# Altium schematic symbol library LATTICEPLDS_Library.SchLib: 291 symbols (part 20 of 32) (continued)
## LFE5U-85F-BG756 (continued)
part H pins: AB10 VCCIO8 (power), AC10 VCCIO8 (power), AG1 PB4A/ D7/IO7 (io), AG3 PB13A/ SN/CSN (io), AG4 INITN (io), AG5 TDO (io), AH1 PB4B/ D6/IO6 (io), AH3 PB13B/ CS1N (io), AH4 PROGRAMN (io), AJ1 PB6A/ D5/MISO2/IO5 (io), AJ2 PB11A/ D1/MISO/IO1 (io), AJ3 PB15A/ HOLDN/DI/BUSY/CSSPIN/CEN (io), AJ4 DONE (io), AJ5 TDI (io), AK1 PB6B/ D4/MOSI2/IO4 (io), AK2 PB11B/ D0/MOSI/IO0 (io), AK3 PB15B/ DOUT/CSON (io), AK4 CFG_2 (io), AK5 TCK (io), AL1 PB9A/ D3/IO3 (io), AL3 PB18A/ WRITEN (io), AL4 CFG_1 (io), AM2 PB9B/ D2/IO2 (io), AM3 CCLK/ MCLK/SCK (io), AM4 CFG_0 (io), AM5 TMS (io)
part I pins: AA11 GND (power), AA22 GND (power), AB11 GND (power), AB12 GND (power), AB13 GND (power), AB14 GND (power), AB15 GND (power), AB16 GND (power), AB17 GND (power), AB18 GND (power), AB19 GND (power), AB20 GND (power), AB21 GND (power), AB22 GND (power), AC12 GND (power), AC21 GND (power), AD2 GND (power), AD5 GND (power), AD28 GND (power), AD31 GND (power), AF11 GND (power), AF12 GND (power), AF14 GND (power), AF15 GND (power), AF16 GND (power), AF17 GND (power), AF19 GND (power), AF20 GND (power), AF23 GND (power), AG11 GND (power), AG14 GND (power), AG15 GND (power), AG16 GND (power), AG17 GND (power), AG20 GND (power), AG23 GND (power), AH2 GND (power), AH5 GND (power), AH7 GND (power), AH8 GND (power), AH11 GND (power), AH14 GND (power), AH15 GND (power), AH16 GND (power), AH17 GND (power), AH20 GND (power), AH23 GND (power), AH24 GND (power), AH25 GND (power), AH26 GND (power), AH29 GND (power), AH31 GND (power), AJ7 GND (power), AJ8 GND (power), AJ11 GND (power), AJ14 GND (power), AJ17 GND (power), AJ20 GND (power), AJ23 GND (power), AJ26 GND (power), AK7 GND (power), AK8 GND (power), AK11 GND (power), AK14 GND (power), AK17 GND (power), AK20 GND (power), AK23 GND (power), AK26 GND (power), AL2 GND (power), AL5 GND (power), AL7 GND (power), AL8 GND (power), AL9 GND (power), AL11 GND (power), AL12 GND (power), AL14 GND (power), AL15 GND (power), AL17 GND (power), AL18 GND (power), AL20 GND (power), AL21 GND (power), AL23 GND (power), AL24 GND (power), AL26 GND (power), AL29 GND (power), AL31 GND (power), AM7 GND (power), AM14 GND (power), AM15 GND (power), AM26 GND (power), B2 GND (power), B5 GND (power), B9 GND (power), B13 GND (power), B15 GND (power), B18 GND (power), B20 GND (power), B24 GND (power), B28 GND (power), B31 GND (power), E2 GND (power), E5 GND (power), E9 GND (power), E13 GND (power), E15 GND (power), E18 GND (power), E20 GND (power), E24 GND (power), E28 GND (power), E31 GND (power), J2 GND (power), J5 GND (power), J28 GND (power), J31 GND (power), K10 GND (power), K11 GND (power), K22 GND (power), K23 GND (power), L10 GND (power), L11 GND (power), L12 GND (power), L13 GND (power), L14 GND (power), L15 GND (power), L16 GND (power), L17 GND (power), L18 GND (power), L19 GND (power), L20 GND (power), L21 GND (power), L22 GND (power), L23 GND (power), M11 GND (power), M22 GND (power), N2 GND (power), N5 GND (power), N11 GND (power), N13 GND (power), N14 GND (power), N15 GND (power), N16 GND (power), N17 GND (power), N18 GND (power), N19 GND (power), N20 GND (power), N22 GND (power), N28 GND (power), N31 GND (power), P11 GND (power), P13 GND (power), P14 GND (power), P15 GND (power), P16 GND (power), P17 GND (power), P18 GND (power), P19 GND (power), P20 GND (power), P22 GND (power), R2 GND (power), R5 GND (power), R11 GND (power), R13 GND (power), R14 GND (power), R15 GND (power), R16 GND (power), R17 GND (power), R18 GND (power), R19 GND (power), R20 GND (power), R22 GND (power), R28 GND (power), R31 GND (power), T11 GND (power), T13 GND (power), T14 GND (power), T15 GND (power), T16 GND (power), T17 GND (power), T18 GND (power), T19 GND (power), T20 GND (power), T22 GND (power), U11 GND (power), U13 GND (power), U14 GND (power), U15 GND (power), U16 GND (power), U17 GND (power), U18 GND (power), U19 GND (power), U20 GND (power), U22 GND (power), V2 GND (power), V5 GND (power), V11 GND (power), V13 GND (power), V14 GND (power), V15 GND (power), V16 GND (power), V17 GND (power), V18 GND (power), V19 GND (power), V20 GND (power), V22 GND (power), V28 GND (power), V31 GND (power), W11 GND (power), W13 GND (power), W14 GND (power), W15 GND (power), W16 GND (power), W17 GND (power), W18 GND (power), W19 GND (power), W20 GND (power), W22 GND (power), Y2 GND (power), Y11 GND (power), Y13 GND (power), Y14 GND (power), Y15 GND (power), Y16 GND (power), Y17 GND (power), Y18 GND (power), Y19 GND (power), Y20 GND (power), Y22 GND (power), Y31 GND (power)
part J pins: AA12 VCC (power), AA13 VCC (power), AA14 VCC (power), AA15 VCC (power), AA16 VCC (power), AA17 VCC (power), AA18 VCC (power), AA19 VCC (power), AA20 VCC (power), AA21 VCC (power), AC11 VCCAUX (power), AC22 VCCAUX (power), AF22 GND (power), AG9 GND (power), AG12 GND (power), AG19 GND (power), AG22 GND (power), AH9 GND (power), AH12 GND (power), AH19 GND (power), AH22 GND (power), AJ9 GND (power), AJ10 GND (power), AJ12 GND (power), AJ13 GND (power), AJ15 GND (power), AJ16 GND (power), AJ18 GND (power), AJ19 GND (power), AJ21 GND (power), AJ22 GND (power), AJ24 GND (power), AJ25 GND (power), K13 VCCAUX (power), K20 VCCAUX (power), M12 VCC (power), M13 VCC (power), M14 VCC (power), M15 VCC (power), M16 VCC (power), M17 VCC (power), M18 VCC (power), M19 VCC (power), M20 VCC (power), M21 VCC (power), N10 VCCAUX (power), N12 VCC (power), N21 VCC (power), N23 VCCAUX (power), P12 VCC (power), P21 VCC (power), R12 VCC (power), R21 VCC (power), T12 VCC (power), T21 VCC (power), U12 VCC (power), U21 VCC (power), V12 VCC (power), V21 VCC (power), W12 VCC (power), W21 VCC (power), Y10 VCCAUX (power), Y12 VCC (power), Y21 VCC (power), Y23 VCCAUX (power)
part K pins: AC4 NC (power), AC13 GND (power), AC14 GND (power), AC15 GND (power), AC16 GND (power), AC17 GND (power), AC18 GND (power), AC19 GND (power), AC20 GND (power), AC29 NC (power), AE7 NC (power), AE26 NC (power), AG2 NC (power), AG24 NC (power), AG31 NC (power), AK9 RESERVED (power), AK10 RESERVED (power), AK12 RESERVED (power), AK13 RESERVED (power), AK15 RESERVED (power), AK16 RESERVED (power), AK18 RESERVED (power), AK19 RESERVED (power), AK21 RESERVED (power), AK22 RESERVED (power), AK24 RESERVED (power), AK25 RESERVED (power), AM8 GND (power), AM9 GND (power), AM11 GND (power), AM12 GND (power), AM17 GND (power), AM18 GND (power), AM20 GND (power), AM21 GND (power), AM23 GND (power), AM24 GND (power), E7 NC (power), E26 NC (power), G9 NC (power), G10 NC (power), G11 NC (power), G14 NC (power), G15 NC (power), G16 NC (power), G17 NC (power), G18 NC (power), G19 NC (power), G22 NC (power), G23 NC (power), G24 NC (power), H4 NC (power), H29 NC (power), L5 NC (power), L28 NC (power), V3 NC (power), V30 NC (power), W6 NC (power), W27 NC (power)

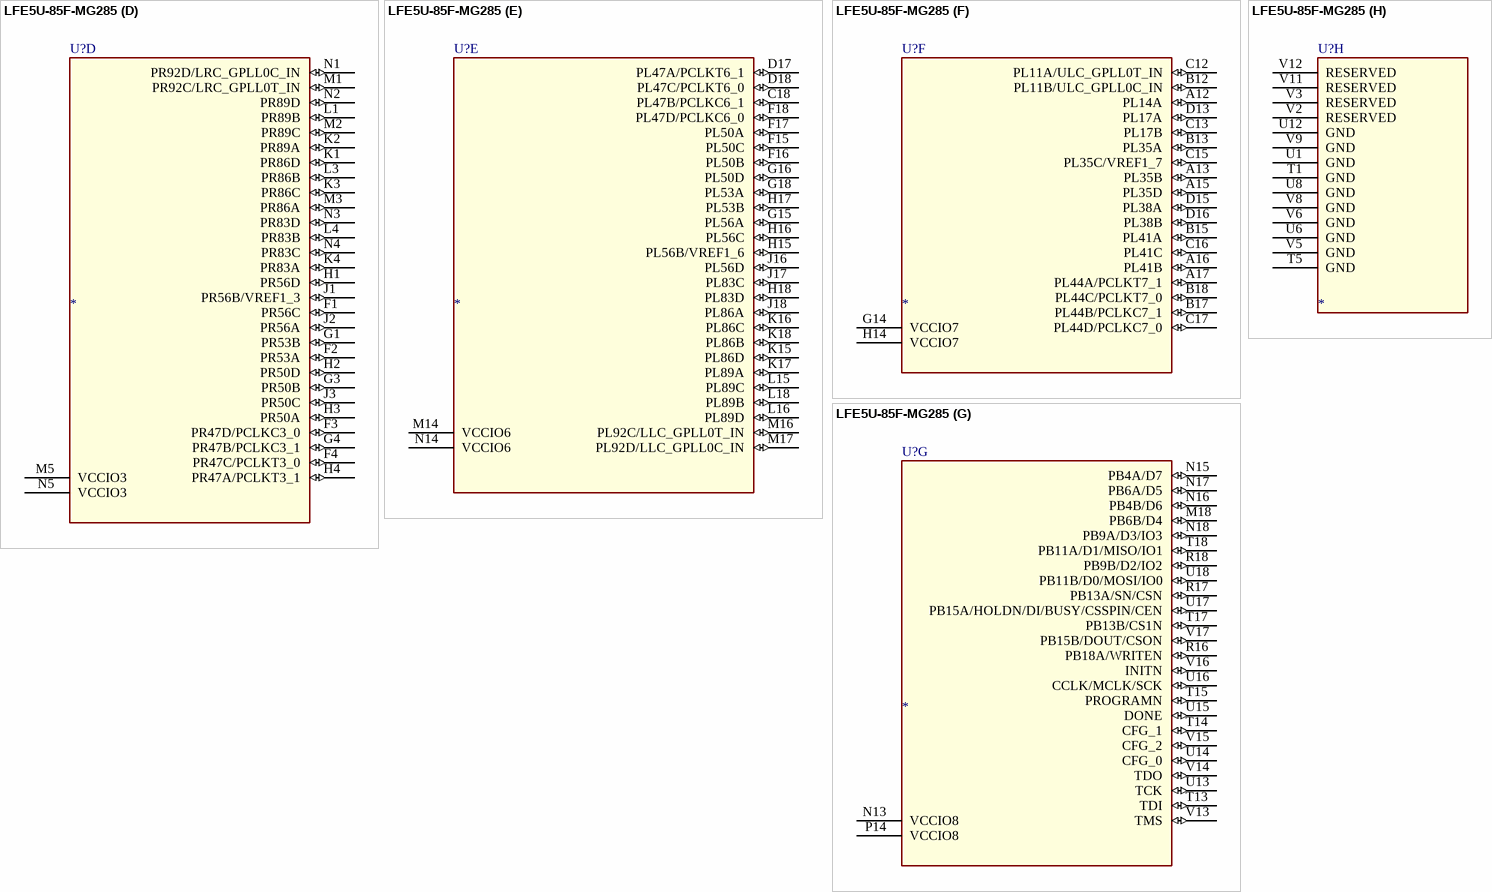
[diagram p188: symbol LFE5U-85F-MG285]

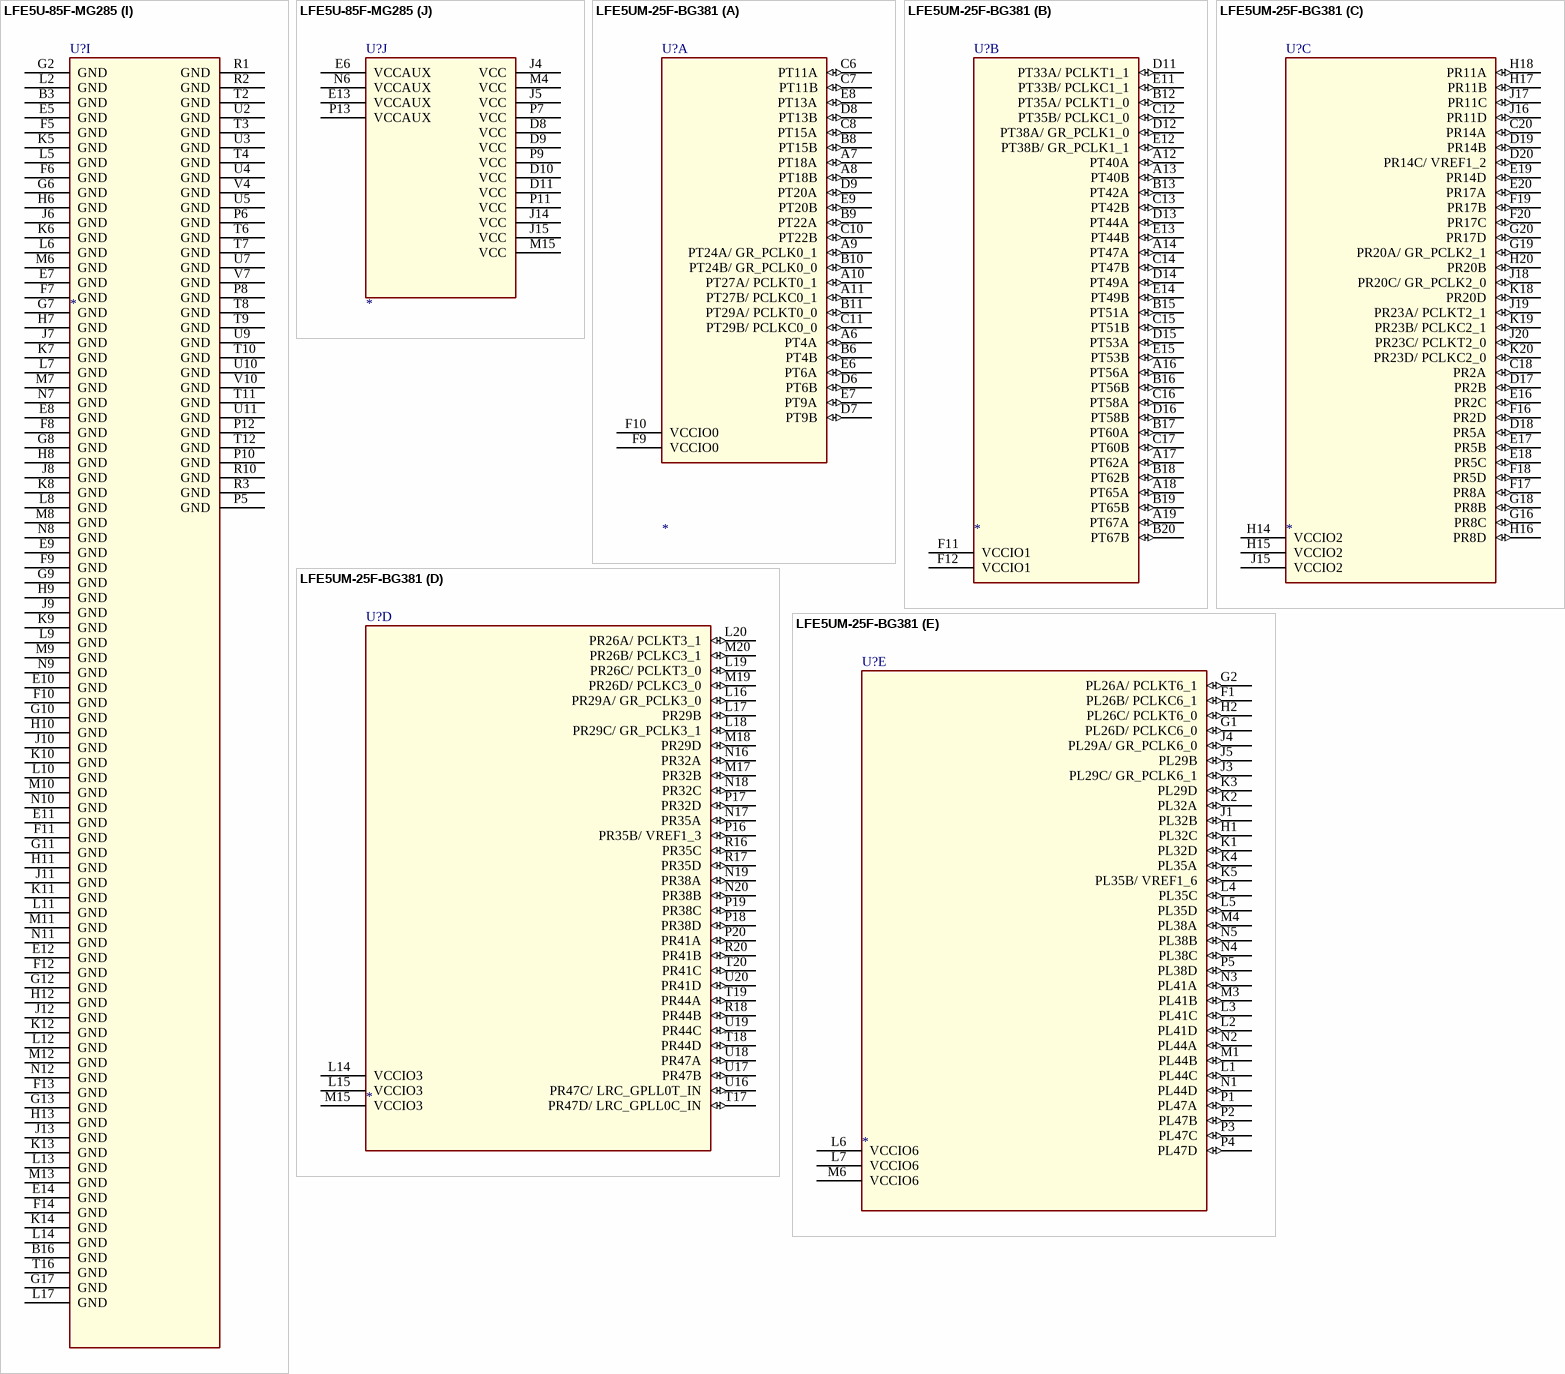
[diagram p189: symbols LFE5U-85F-MG285 to LFE5UM-25F-BG381]

## LFE5U-85F-MG285
designator U?
SWAP_INFO: (S1+S2+S3+S4+S5+S6+S7+S8+S9+S10); SPLIT_INST: TRUE
part A pins: A10 PT63B/PCLKC0_1 (io), A11 PT63A/PCLKT0_1 (io), B10 PT65A/PCLKT0_0 (io), B11 PT4A/ULC_GPLL1T_IN (io), C10 PT65B/PCLKC0_0 (io), C11 PT4B/ULC_GPLL1C_IN (io), D12 VCCIO0 (power)
part B pins: A8 PT71B/PCLKC1_0 (io), A9 PT71A/PCLKT1_0 (io), B8 PT121A/URC_GPLL1T_IN (io), B9 PT69A/PCLKT1_1 (io), C8 PT121B/URC_GPLL1C_IN (io), C9 PT69B/PCLKC1_1 (io), D7 VCCIO1 (power)
part C pins: A2 PR41C (io), A3 PR41A (io), A4 PR20B (io), A6 PR20A (io), A7 PR17B (io), B1 PR44B/PCLKC2_1 (io), B2 PR41B (io), B4 PR35C/VREF1_2 (io), B6 PR17A (io), B7 PR11B/URC_GPLL0C_IN (io), C1 PR44C/PCLKT2_0 (io), C2 PR38B (io), C3 PR35D (io), C4 PR35B (io), C6 PR14B (io), C7 PR11A/URC_GPLL0T_IN (io), D1 PR44D/PCLKC2_0 (io), D2 PR44A/PCLKT2_1 (io), D3 PR38A (io), D4 PR35A (io), D6 PR14A (io), G5 VCCIO2 (power), H5 VCCIO2 (power)
part D pins: F1 PR56C (io), F2 PR53A (io), F3 PR47D/PCLKC3_0 (io), F4 PR47C/PCLKT3_0 (io), G1 PR53B (io), G3 PR50B (io), G4 PR47B/PCLKC3_1 (io), H1 PR56D (io), H2 PR50D (io), H3 PR50A (io), H4 PR47A/PCLKT3_1 (io), J1 PR56B/VREF1_3 (io), J2 PR56A (io), J3 PR50C (io), K1 PR86D (io), K2 PR89A (io), K3 PR86C (io), K4 PR83A (io), L1 PR89B (io), L3 PR86B (io), L4 PR83B (io), M1 PR92C/LRC_GPLL0T_IN (io), M2 PR89C (io), M3 PR86A (io), M5 VCCIO3 (power), N1 PR92D/LRC_GPLL0C_IN (io), N2 PR89D (io), N3 PR83D (io), N4 PR83C (io), N5 VCCIO3 (power)
part E pins: C18 PL47B/PCLKC6_1 (io), D17 PL47A/PCLKT6_1 (io), D18 PL47C/PCLKT6_0 (io), F15 PL50C (io), F16 PL50B (io), F17 PL50A (io), F18 PL47D/PCLKC6_0 (io), G15 PL56A (io), G16 PL50D (io), G18 PL53A (io), H15 PL56B/VREF1_6 (io), H16 PL56C (io), H17 PL53B (io), H18 PL83D (io), J16 PL56D (io), J17 PL83C (io), J18 PL86A (io), K15 PL86D (io), K16 PL86C (io), K17 PL89A (io), K18 PL86B (io), L15 PL89C (io), L16 PL89D (io), L18 PL89B (io), M14 VCCIO6 (power), M16 PL92C/LLC_GPLL0T_IN (io), M17 PL92D/LLC_GPLL0C_IN (io), N14 VCCIO6 (power)
part F pins: A12 PL14A (io), A13 PL35B (io), A15 PL35D (io), A16 PL41B (io), A17 PL44A/PCLKT7_1 (io), B12 PL11B/ULC_GPLL0C_IN (io), B13 PL35A (io), B15 PL41A (io), B17 PL44B/PCLKC7_1 (io), B18 PL44C/PCLKT7_0 (io), C12 PL11A/ULC_GPLL0T_IN (io), C13 PL17B (io), C15 PL35C/VREF1_7 (io), C16 PL41C (io), C17 PL44D/PCLKC7_0 (io), D13 PL17A (io), D15 PL38A (io), D16 PL38B (io), G14 VCCIO7 (power), H14 VCCIO7 (power)
part G pins: M18 PB6B/D4 (io), N13 VCCIO8 (power), N15 PB4A/D7 (io), N16 PB4B/D6 (io), N17 PB6A/D5 (io), N18 PB9A/D3/IO3 (io), P14 VCCIO8 (power), R16 PB18A/WRITEN (io), R17 PB13A/SN/CSN (io), R18 PB9B/D2/IO2 (io), T13 TDI (io), T14 CFG_1 (io), T15 PROGRAMN (io), T17 PB13B/CS1N (io), T18 PB11A/D1/MISO/IO1 (io), U13 TCK (io), U14 CFG_0 (io), U15 DONE (io), U16 CCLK/MCLK/SCK (io), U17 PB15A/HOLDN/DI/BUSY/CSSPIN/CEN (io), U18 PB11B/D0/MOSI/IO0 (io), V13 TMS (io), V14 TDO (io), V15 CFG_2 (io), V16 INITN (io), V17 PB15B/DOUT/CSON (io)
part H pins: T1 GND (power), T5 GND (power), U1 GND (power), U6 GND (power), U8 GND (power), U12 GND (power), V2 RESERVED (power), V3 RESERVED (power), V5 GND (power), V6 GND (power), V8 GND (power), V9 GND (power), V11 RESERVED (power), V12 RESERVED (power)
part I pins: B3 GND (power), B16 GND (power), E5 GND (power), E7 GND (power), E8 GND (power), E9 GND (power), E10 GND (power), E11 GND (power), E12 GND (power), E14 GND (power), F5 GND (power), F6 GND (power), F7 GND (power), F8 GND (power), F9 GND (power), F10 GND (power), F11 GND (power), F12 GND (power), F13 GND (power), F14 GND (power), G2 GND (power), G6 GND (power), G7 GND (power), G8 GND (power), G9 GND (power), G10 GND (power), G11 GND (power), G12 GND (power), G13 GND (power), G17 GND (power), H6 GND (power), H7 GND (power), H8 GND (power), H9 GND (power), H10 GND (power), H11 GND (power), H12 GND (power), H13 GND (power), J6 GND (power), J7 GND (power), J8 GND (power), J9 GND (power), J10 GND (power), J11 GND (power), J12 GND (power), J13 GND (power), K5 GND (power), K6 GND (power), K7 GND (power), K8 GND (power), K9 GND (power), K10 GND (power), K11 GND (power), K12 GND (power), K13 GND (power), K14 GND (power), L2 GND (power), L5 GND (power), L6 GND (power), L7 GND (power), L8 GND (power), L9 GND (power), L10 GND (power), L11 GND (power), L12 GND (power), L13 GND (power), L14 GND (power), L17 GND (power), M6 GND (power), M7 GND (power), M8 GND (power), M9 GND (power), M10 GND (power), M11 GND (power), M12 GND (power), M13 GND (power), N7 GND (power), N8 GND (power), N9 GND (power), N10 GND (power), N11 GND (power), N12 GND (power), P5 GND (power), P6 GND (power), P8 GND (power), P10 GND (power), P12 GND (power), R1 GND (power), R2 GND (power), R3 GND (power), R10 GND (power), T2 GND (power), T3 GND (power), T4 GND (power), T6 GND (power), T7 GND (power), T8 GND (power), T9 GND (power), T10 GND (power), T11 GND (power), T12 GND (power), T16 GND (power), U2 GND (power), U3 GND (power), U4 GND (power), U5 GND (power), U7 GND (power), U9 GND (power), U10 GND (power), U11 GND (power), V4 GND (power), V7 GND (power), V10 GND (power)
part J pins: D8 VCC (power), D9 VCC (power), D10 VCC (power), D11 VCC (power), E6 VCCAUX (power), E13 VCCAUX (power), J4 VCC (power), J5 VCC (power), J14 VCC (power), J15 VCC (power), M4 VCC (power), M15 VCC (power), N6 VCCAUX (power), P7 VCC (power), P9 VCC (power), P11 VCC (power), P13 VCCAUX (power)

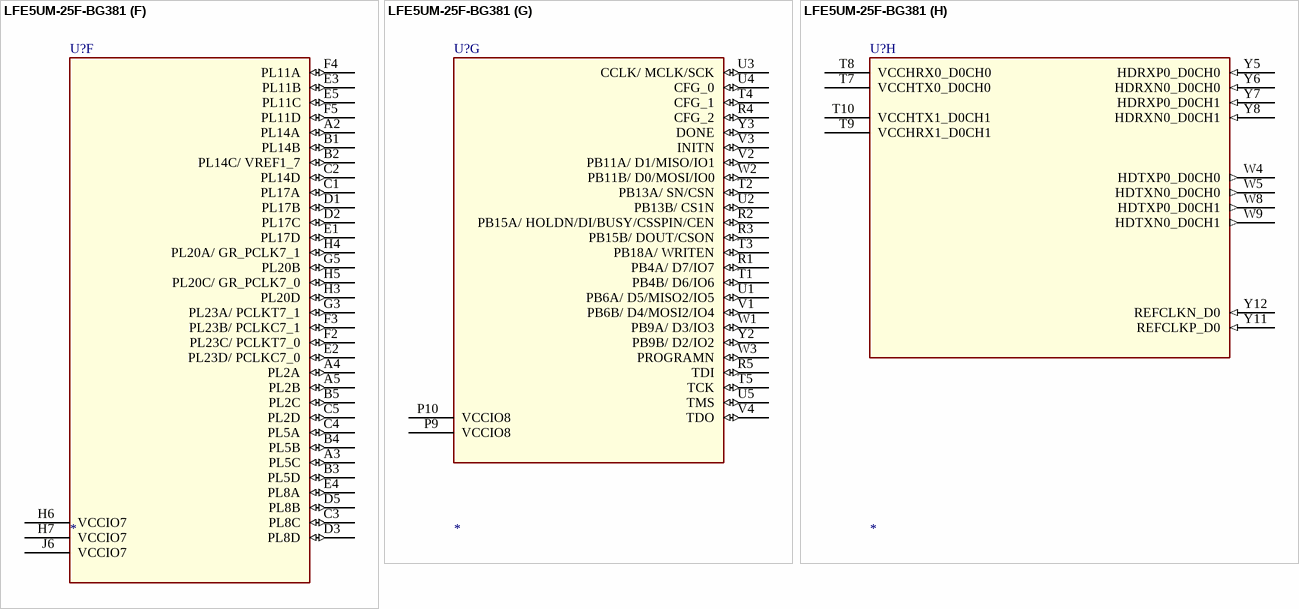
[diagram p190: symbol LFE5UM-25F-BG381]

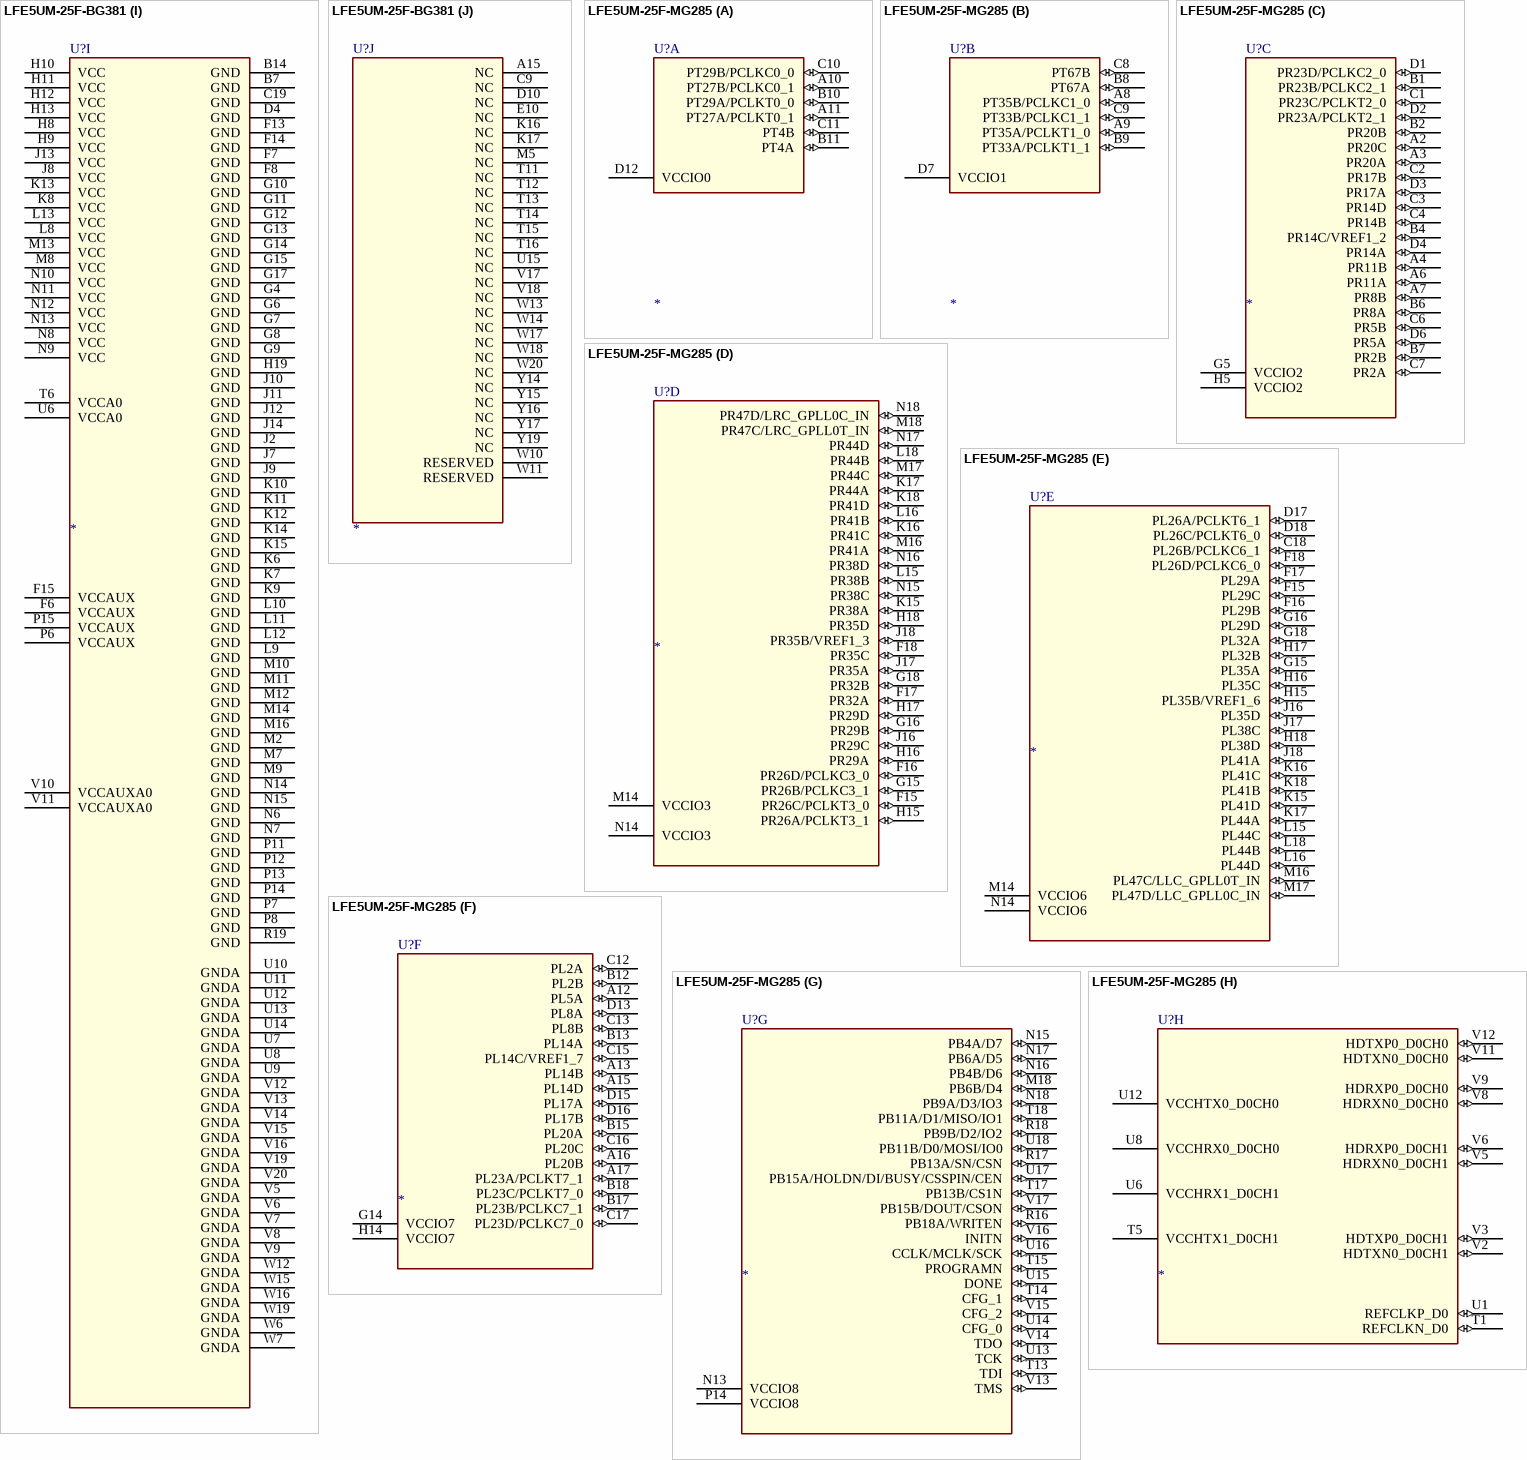
[diagram p191: symbols LFE5UM-25F-BG381 to LFE5UM-25F-MG285]

## LFE5UM-25F-BG381
designator U?
SWAP_INFO: (S1+S2+S3+S4+S5+S6+S7+S8+S9+S10); SPLIT_INST: TRUE
part A pins: A6 PT4A (io), A7 PT18A (io), A8 PT18B (io), A9 PT24A/ GR_PCLK0_1 (io), A10 PT27A/ PCLKT0_1 (io), A11 PT27B/ PCLKC0_1 (io), B6 PT4B (io), B8 PT15B (io), B9 PT22A (io), B10 PT24B/ GR_PCLK0_0 (io), B11 PT29A/ PCLKT0_0 (io), C6 PT11A (io), C7 PT11B (io), C8 PT15A (io), C10 PT22B (io), C11 PT29B/ PCLKC0_0 (io), D6 PT6B (io), D7 PT9B (io), D8 PT13B (io), D9 PT20A (io), E6 PT6A (io), E7 PT9A (io), E8 PT13A (io), E9 PT20B (io), F9 VCCIO0 (power), F10 VCCIO0 (power)
part B pins: A12 PT40A (io), A13 PT40B (io), A14 PT47A (io), A16 PT56A (io), A17 PT62A (io), A18 PT65A (io), A19 PT67A (io), B12 PT35A/ PCLKT1_0 (io), B13 PT42A (io), B15 PT51A (io), B16 PT56B (io), B17 PT60A (io), B18 PT62B (io), B19 PT65B (io), B20 PT67B (io), C12 PT35B/ PCLKC1_0 (io), C13 PT42B (io), C14 PT47B (io), C15 PT51B (io), C16 PT58A (io), C17 PT60B (io), D11 PT33A/ PCLKT1_1 (io), D12 PT38A/ GR_PCLK1_0 (io), D13 PT44A (io), D14 PT49A (io), D15 PT53A (io), D16 PT58B (io), E11 PT33B/ PCLKC1_1 (io), E12 PT38B/ GR_PCLK1_1 (io), E13 PT44B (io), E14 PT49B (io), E15 PT53B (io), F11 VCCIO1 (power), F12 VCCIO1 (power)
part C pins: C18 PR2A (io), C20 PR14A (io), D17 PR2B (io), D18 PR5A (io), D19 PR14B (io), D20 PR14C/ VREF1_2 (io), E16 PR2C (io), E17 PR5B (io), E18 PR5C (io), E19 PR14D (io), E20 PR17A (io), F16 PR2D (io), F17 PR8A (io), F18 PR5D (io), F19 PR17B (io), F20 PR17C (io), G16 PR8C (io), G18 PR8B (io), G19 PR20A/ GR_PCLK2_1 (io), G20 PR17D (io), H14 VCCIO2 (power), H15 VCCIO2 (power), H16 PR8D (io), H17 PR11B (io), H18 PR11A (io), H20 PR20B (io), J15 VCCIO2 (power), J16 PR11D (io), J17 PR11C (io), J18 PR20C/ GR_PCLK2_0 (io), J19 PR23A/ PCLKT2_1 (io), J20 PR23C/ PCLKT2_0 (io), K18 PR20D (io), K19 PR23B/ PCLKC2_1 (io), K20 PR23D/ PCLKC2_0 (io)
part D pins: L14 VCCIO3 (power), L15 VCCIO3 (power), L16 PR29A/ GR_PCLK3_0 (io), L17 PR29B (io), L18 PR29C/ GR_PCLK3_1 (io), L19 PR26C/ PCLKT3_0 (io), L20 PR26A/ PCLKT3_1 (io), M15 VCCIO3 (power), M17 PR32B (io), M18 PR29D (io), M19 PR26D/ PCLKC3_0 (io), M20 PR26B/ PCLKC3_1 (io), N16 PR32A (io), N17 PR35A (io), N18 PR32C (io), N19 PR38A (io), N20 PR38B (io), P16 PR35B/ VREF1_3 (io), P17 PR32D (io), P18 PR38D (io), P19 PR38C (io), P20 PR41A (io), R16 PR35C (io), R17 PR35D (io), R18 PR44B (io), R20 PR41B (io), T17 PR47D/ LRC_GPLL0C_IN (io), T18 PR44D (io), T19 PR44A (io), T20 PR41C (io), U16 PR47C/ LRC_GPLL0T_IN (io), U17 PR47B (io), U18 PR47A (io), U19 PR44C (io), U20 PR41D (io)
part E pins: F1 PL26B/ PCLKC6_1 (io), G1 PL26D/ PCLKC6_0 (io), G2 PL26A/ PCLKT6_1 (io), H1 PL32C (io), H2 PL26C/ PCLKT6_0 (io), J1 PL32B (io), J3 PL29C/ GR_PCLK6_1 (io), J4 PL29A/ GR_PCLK6_0 (io), J5 PL29B (io), K1 PL32D (io), K2 PL32A (io), K3 PL29D (io), K4 PL35A (io), K5 PL35B/ VREF1_6 (io), L1 PL44C (io), L2 PL41D (io), L3 PL41C (io), L4 PL35C (io), L5 PL35D (io), L6 VCCIO6 (power), L7 VCCIO6 (power), M1 PL44B (io), M3 PL41B (io), M4 PL38A (io), M6 VCCIO6 (power), N1 PL44D (io), N2 PL44A (io), N3 PL41A (io), N4 PL38C (io), N5 PL38B (io), P1 PL47A (io), P2 PL47B (io), P3 PL47C (io), P4 PL47D (io), P5 PL38D (io)
part F pins: A2 PL14A (io), A3 PL5C (io), A4 PL2A (io), A5 PL2B (io), B1 PL14B (io), B2 PL14C/ VREF1_7 (io), B3 PL5D (io), B4 PL5B (io), B5 PL2C (io), C1 PL17A (io), C2 PL14D (io), C3 PL8C (io), C4 PL5A (io), C5 PL2D (io), D1 PL17B (io), D2 PL17C (io), D3 PL8D (io), D5 PL8B (io), E1 PL17D (io), E2 PL23D/ PCLKC7_0 (io), E3 PL11B (io), E4 PL8A (io), E5 PL11C (io), F2 PL23C/ PCLKT7_0 (io), F3 PL23B/ PCLKC7_1 (io), F4 PL11A (io), F5 PL11D (io), G3 PL23A/ PCLKT7_1 (io), G5 PL20B (io), H3 PL20D (io), H4 PL20A/ GR_PCLK7_1 (io), H5 PL20C/ GR_PCLK7_0 (io), H6 VCCIO7 (power), H7 VCCIO7 (power), J6 VCCIO7 (power)
part G pins: P9 VCCIO8 (power), P10 VCCIO8 (power), R1 PB4A/ D7/IO7 (io), R2 PB15A/ HOLDN/DI/BUSY/CSSPIN/CEN (io), R3 PB15B/ DOUT/CSON (io), R4 CFG_2 (io), R5 TDI (io), T1 PB4B/ D6/IO6 (io), T2 PB13A/ SN/CSN (io), T3 PB18A/ WRITEN (io), T4 CFG_1 (io), T5 TCK (io), U1 PB6A/ D5/MISO2/IO5 (io), U2 PB13B/ CS1N (io), U3 CCLK/ MCLK/SCK (io), U4 CFG_0 (io), U5 TMS (io), V1 PB6B/ D4/MOSI2/IO4 (io), V2 PB11A/ D1/MISO/IO1 (io), V3 INITN (io), V4 TDO (io), W1 PB9A/ D3/IO3 (io), W2 PB11B/ D0/MOSI/IO0 (io), W3 PROGRAMN (io), Y2 PB9B/ D2/IO2 (io), Y3 DONE (io)
part H pins: T7 VCCHTX0_D0CH0 (power), T8 VCCHRX0_D0CH0 (power), T9 VCCHRX1_D0CH1 (power), T10 VCCHTX1_D0CH1 (power), W4 HDTXP0_D0CH0 (out), W5 HDTXN0_D0CH0 (out), W8 HDTXP0_D0CH1 (out), W9 HDTXN0_D0CH1 (out), Y5 HDRXP0_D0CH0 (in), Y6 HDRXN0_D0CH0 (in), Y7 HDRXP0_D0CH1 (in), Y8 HDRXN0_D0CH1 (in), Y11 REFCLKP_D0 (in), Y12 REFCLKN_D0 (in)
part I pins: B7 GND (power), B14 GND (power), C19 GND (power), D4 GND (power), F6 VCCAUX (power), F7 GND (power), F8 GND (power), F13 GND (power), F14 GND (power), F15 VCCAUX (power), G4 GND (power), G6 GND (power), G7 GND (power), G8 GND (power), G9 GND (power), G10 GND (power), G11 GND (power), G12 GND (power), G13 GND (power), G14 GND (power), G15 GND (power), G17 GND (power), H8 VCC (power), H9 VCC (power), H10 VCC (power), H11 VCC (power), H12 VCC (power), H13 VCC (power), H19 GND (power), J2 GND (power), J7 GND (power), J8 VCC (power), J9 GND (power), J10 GND (power), J11 GND (power), J12 GND (power), J13 VCC (power), J14 GND (power), K6 GND (power), K7 GND (power), K8 VCC (power), K9 GND (power), K10 GND (power), K11 GND (power), K12 GND (power), K13 VCC (power), K14 GND (power), K15 GND (power), L8 VCC (power), L9 GND (power), L10 GND (power), L11 GND (power), L12 GND (power), L13 VCC (power), M2 GND (power), M7 GND (power), M8 VCC (power), M9 GND (power), M10 GND (power), M11 GND (power), M12 GND (power), M13 VCC (power), M14 GND (power), M16 GND (power), N6 GND (power), N7 GND (power), N8 VCC (power), N9 VCC (power), N10 VCC (power), N11 VCC (power), N12 VCC (power), N13 VCC (power), N14 GND (power), N15 GND (power), P6 VCCAUX (power), P7 GND (power), P8 GND (power), P11 GND (power), P12 GND (power), P13 GND (power), P14 GND (power), P15 VCCAUX (power), R19 GND (power), T6 VCCA0 (power), U6 VCCA0 (power), U7 GNDA (power), U8 GNDA (power), U9 GNDA (power), U10 GNDA (power), U11 GNDA (power), U12 GNDA (power), U13 GNDA (power), U14 GNDA (power), V5 GNDA (power), V6 GNDA (power), V7 GNDA (power), V8 GNDA (power), V9 GNDA (power), V10 VCCAUXA0 (power), V11 VCCAUXA0 (power), V12 GNDA (power), V13 GNDA (power), V14 GNDA (power), V15 GNDA (power), V16 GNDA (power), V19 GNDA (power), V20 GNDA (power), W6 GNDA (power), W7 GNDA (power), W12 GNDA (power), W15 GNDA (power), W16 GNDA (power), W19 GNDA (power)